# Altium footprint library PcbLib1.PcbLib: 157 footprints (part 9 of 10)
Each footprint in its own frame and in the unit in brackets; x right, y up, seen from the top. Pads: shape width x height; smd on the part's side, far side on the other; paste and mask are expansions set on the pad; w line width, h text height; cw(c..) or ccw(c..) is an arc to the next point about the centre after c.
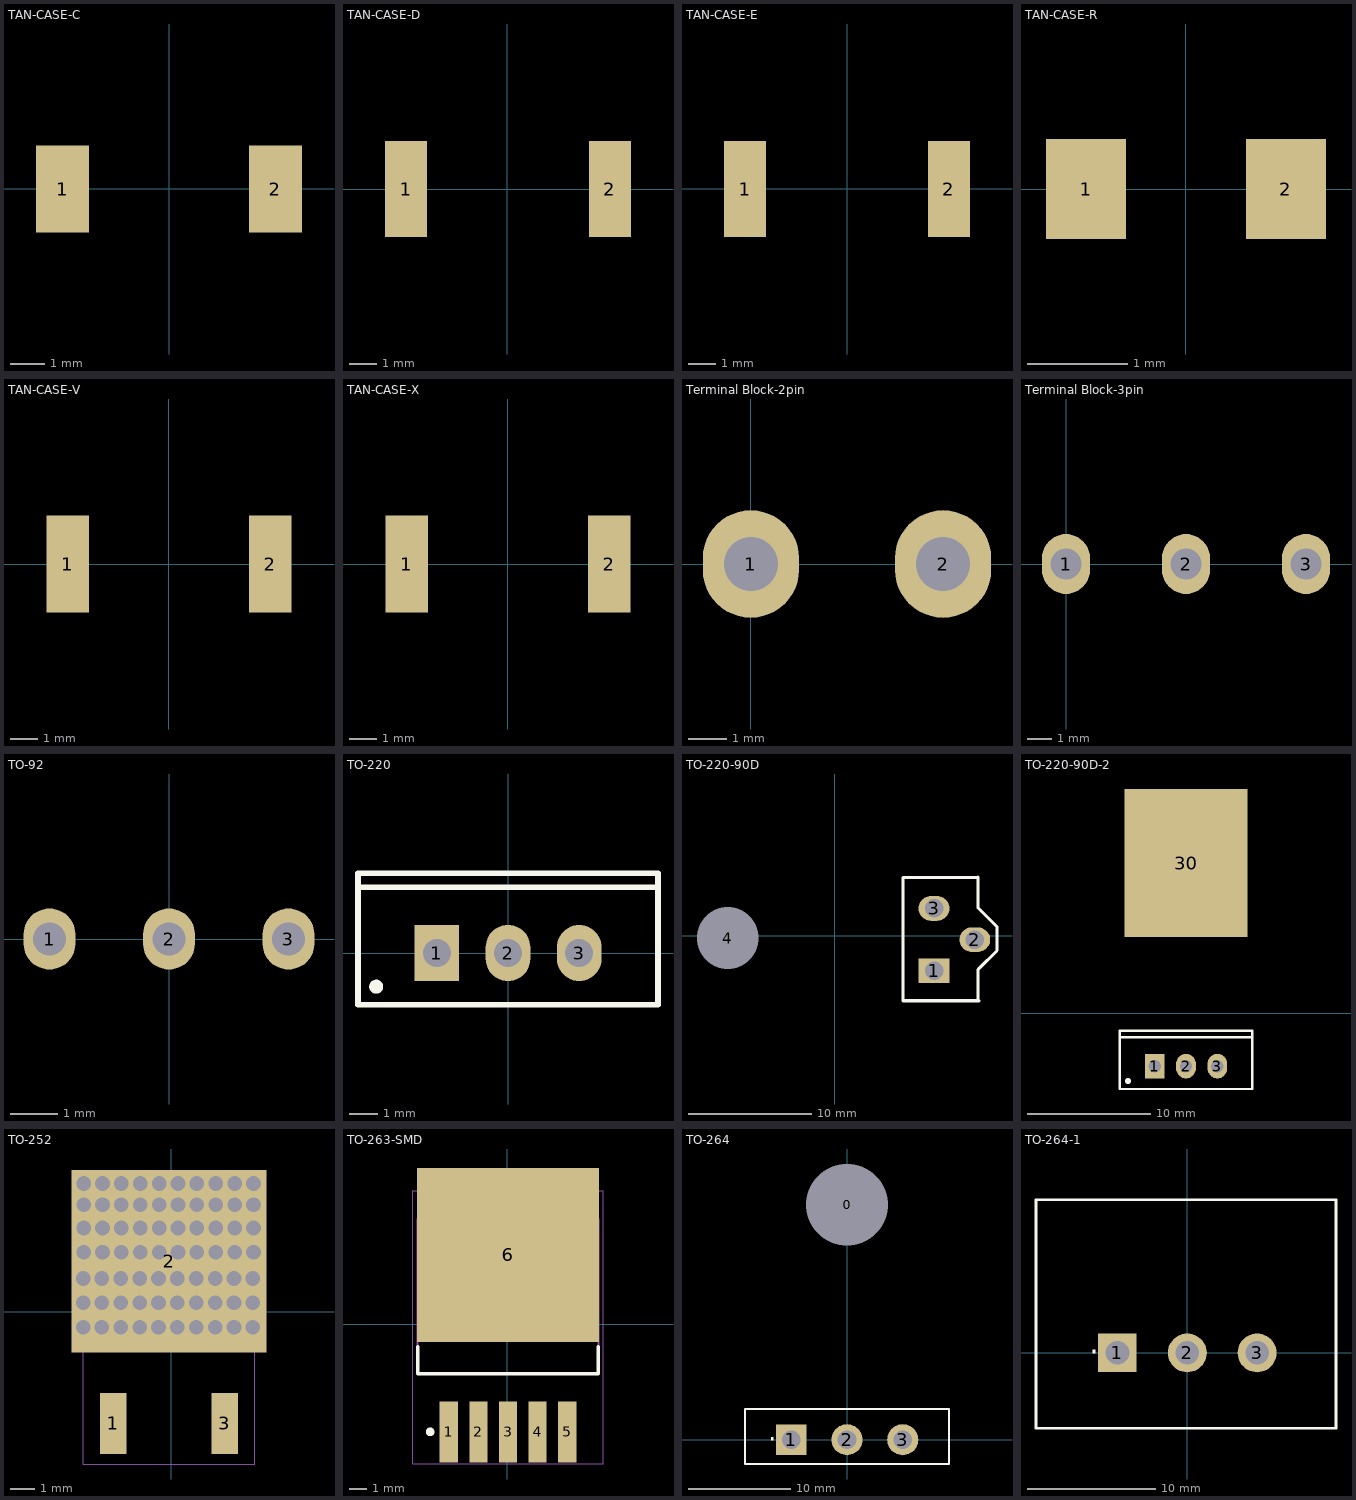
[diagram p8: the footprints below, top view; thin cyan lines are the x and y axes]

## TAN-CASE-C [mm]
pads (2):
  rect 1.524x2.5 smd: 1(-3.05,0) 2(3.05,0)
3D body "User Library-AVX_C_CASE.STEP": height 2.7, standoff 0, extent -3.05,-1.675 3.05,1.675

## TAN-CASE-D [mm]
pads (2):
  rect 1.524x3.5 smd: 1(-3.675,0) 2(3.726,0)
3D body "User Library-AVX_D_CASE.STEP": height 3.01, standoff 0, extent -3.675,-2.225 3.725,2.225

## TAN-CASE-E [mm]
pads (2):
  rect 1.524x3.5 smd: 1(-3.7,0) 2(3.7,0)
3D body "User Library-AVX_E_CASE.STEP": height 4.2, standoff 0, extent -3.7,-2.225 3.7,2.225

## TAN-CASE-R [mm]
pads (2):
  rect 0.8x1 smd: 1(-1,0) 2(1,0)
3D body "User Library-CaseR_2012-12.STEP": height 1.2, standoff 0, extent -1,-0.65 1,0.65

## TAN-CASE-V [mm]
pads (2):
  rect 1.524x3.5 smd: 1(-3.65,0) 2(3.65,0)
3D body "User Library-CaseV_7343-20.STEP": height 2, standoff 0, extent -3.65,-2.15 3.65,2.15

## TAN-CASE-X [mm]
pads (2):
  rect 1.524x3.5 smd: 1(-3.65,0) 2(3.65,0)
3D body "User Library-CaseX_7343-43.STEP": height 4, standoff 0, extent -3.65,-2.15 3.65,2.15

## Terminal Block-2pin [mm]
pads (2):
  oval 2.5x2.8 hole 1.4: 1(0,0) 2(5,0)
3D body "User Library-DG300-5_0-02P-14.STEP": height 12.6, standoff -4.4, extent -3.1,-3.975 7.5,5.025

## Terminal Block-3pin [mm]
pads (3):
  oval 2x2.5 hole 1.3: 1(0,0) 2(5,0) 3(10,0)
3D body "User Library-Terminal block 3 POS.STEP": height 10, standoff -3.05, extent -2.625,-3.175 12.615,4.325

## TO-92 [mm]
pads (3):
  oval 1.1x1.3 hole 0.7: 1(-2.54,0) 2(0,0) 3(2.54,0)
3D body "User Library-TO-92_SS127.STEP": height 8.5, standoff -4, extent -2.77,-1.37 2.77,2.5

## TO-220 [mm]
pads (3):
  rect 1.6x2 hole 1: 1(-2.54,0)
  oval 1.6x2 hole 1: 2(0,0) 3(2.54,0)
Top Overlay:
  circle w0.25: c-4.7,-1.2 r0.125
  lines w0.2: -5.35,2.35 5.35,2.35 ; -5.35,-1.85 5.35,-1.85 5.35,2.85 -5.35,2.85 -5.35,-1.85
Mechanical 13:
  lines w0.1: -5.35,-1.85 -5.35,2.85 5.35,2.85 5.35,-1.85 -5.35,-1.85
Mechanical 15:
  lines w0.1: -0.5,0 0.5,0 ; 0,-0.5 0,0.5
3D body "User Library-Generic TO-220.STEP": height 18.66, standoff -5, extent -4.96,-2.11 4.96,2.425

## TO-220-90D [mm]
pads (4):
  rect 2.5x2 hole 1.5: 1(8.025,-2.85)
  oval 2.5x2 hole 1.5: 2(11.325,-0.325) 3(8.025,2.2)
  oval 2x1.6 hole 5: 4(-8.675,-0.2)
Top Overlay:
  lines w0.254: 5.525,-5.275 5.525,4.7 11.575,4.7 11.6,4.725 11.6,2.237 13.125,0.712 13.125,-1.212 11.6,-2.738 11.6,-5.225 11.65,-5.275 5.525,-5.275
3D body "User Library-Part1-106.STEP": height 0.45, standoff -8.36, extent -11.675,-5.325 11.575,4.695

## TO-220-90D-2 [mm]
pads (4):
  rect 1.6x2 hole 1: 1(11.385,-4.275)
  oval 1.6x2 hole 1: 2(13.925,-4.275) 3(16.465,-4.275)
  rect 10x12 smd: 30(13.925,12.175)
Top Overlay:
  circle w0.25: c9.225,-5.475 r0.125
  lines w0.2: 8.575,-1.925 19.275,-1.925 ; 8.575,-6.125 8.575,-1.425 19.275,-1.425 19.275,-6.125 8.575,-6.125
Mechanical 13:
  lines w0.1: 8.575,-6.125 19.275,-6.125 19.275,-1.425 8.575,-1.425 8.575,-6.125
Mechanical 15:
  lines w0.1: 13.425,-4.275 14.425,-4.275 ; 13.925,-4.775 13.925,-3.775
3D body "User Library-TO220-1.STEP": height 4.5, standoff -3.5, extent 8.75,-4.45 19.15,16.65

## TO-252 [mm]
pads (73):
  rect 1.1x2.5 smd: 1(-2.386,-4.573) 3(2.194,-4.573)
  round 0 hole 0.6: 2(-3.625,-0.625) 2(-3.625,0.375) 2(-3.625,1.375) 2(-3.6,2.45) 2(-3.6,3.45) 2(-3.6,4.4) 2(-3.6,5.275) 2(-2.85,-0.625) 2(-2.85,0.375) 2(-2.85,1.375) 2(-2.825,2.45) 2(-2.825,3.45) 2(-2.825,4.4) 2(-2.825,5.275) 2(-2.075,-0.625) 2(-2.075,0.375) 2(-2.075,1.375) 2(-2.05,2.45) 2(-2.05,3.45) 2(-2.05,4.4) 2(-2.05,5.275) 2(-1.3,-0.625) 2(-1.3,0.375) 2(-1.3,1.375) 2(-1.275,2.45) 2(-1.275,3.45) 2(-1.275,4.4) 2(-1.275,5.275) 2(-0.525,-0.625) 2(-0.525,0.375) 2(-0.525,1.375) 2(-0.5,2.45) 2(-0.5,3.45) 2(-0.5,4.4) 2(-0.5,5.275) 2(0.25,-0.625) 2(0.25,0.375) 2(0.25,1.375) 2(0.275,2.45) 2(0.275,3.45) 2(0.275,4.4) 2(0.275,5.275) 2(1.025,-0.625) 2(1.025,0.375) 2(1.025,1.375) 2(1.05,2.45) 2(1.05,3.45) 2(1.05,4.4) 2(1.05,5.275) 2(1.8,-0.625) 2(1.8,0.375) 2(1.8,1.375) 2(1.825,2.45) 2(1.825,3.45) 2(1.825,4.4) 2(1.825,5.275) 2(2.575,-0.625) 2(2.575,0.375) 2(2.575,1.375) 2(2.6,2.45) 2(2.6,3.45) 2(2.6,4.4) 2(2.6,5.275) 2(3.35,-0.625) 2(3.35,0.375) 2(3.35,1.375) 2(3.375,2.45) 2(3.375,3.45) 2(3.375,4.4) 2(3.375,5.275)
  rect 8x7.5 smd paste-4: 2(-0.096,2.077)
Top Paste:
  region: 2.184,0.702 2.184,-0.608 0.444,-0.608 0.444,0.702
  region: 2.184,4.762 2.184,3.452 0.444,3.452 0.444,4.762
  region: -0.636,4.762 -0.636,3.452 -2.376,3.452 -2.376,4.762
  region: -0.636,0.702 -0.636,-0.608 -2.376,-0.608 -2.376,0.702
  region: 2.184,2.732 2.184,1.422 0.444,1.422 0.444,2.732
  region: -0.636,2.732 -0.636,1.422 -2.376,1.422 -2.376,2.732
Mechanical 15:
  lines w0.05: -3.616,-6.243 -3.616,5.377 3.424,5.377 3.424,-6.243 -3.616,-6.243
3D body "CircuitWorks-TO-252.STEP": height 2.3, standoff 0, extent -3.39,-5.248 3.19,4.452

## TO-263-SMD [mm]
pads (6):
  rect 1.05x3.5 smd: 1(-3.35,-6.174) 2(-1.65,-6.174) 3(0.05,-6.174) 4(1.75,-6.174) 5(3.45,-6.174)
  rect 10.45x10 smd: 6(0.05,4)
Top Overlay:
  circle w0.25: c-4.425,-6.174 r0.125
  lines w0.2: -5.15,-1.274 -5.15,-2.824 5.25,-2.824 5.25,-1.274
Mechanical 13:
  lines w0.1: -5.15,-2.824 5.25,-2.824 5.25,6.066 -5.15,6.066 -5.15,-2.824
Mechanical 15:
  lines w0.05: -5.425,-8.024 5.525,-8.024 5.525,7.676 -5.425,7.676 -5.425,-8.024
  lines w0.1: -0.45,-0.174 0.55,-0.174 ; 0.05,-0.674 0.05,0.326
3D body "SW3dPS-TO263-5.STEP": height 4.68, standoff -0.12, extent -4.95,-7.704 5.05,7.966

## TO-264 [mm]
pads (4):
  round 1.6 hole 8: 0(0,23)
  rect 3x3 hole 1.85: 1(-5.46,0)
  round 3.048 hole 1.85: 2(0,0) 3(5.46,0)
Top Overlay:
  region: -7.4,-0.05 -7.4,0.25 -7.2,0.25 -7.2,-0.05
  lines w0.2: -10,-2.38 -10,3.02 10,3.02 10,-2.38 -10,-2.38
3D body "User Library-TO-264-H.STEP": height 3.1, standoff -15, extent -10.284,-0.356 10.216,30.923

## TO-264-1 [mm]
pads (3):
  rect 3x3 hole 1.85: 1(-5.46,0)
  round 3.048 hole 1.85: 2(0,0) 3(5.46,0)
Top Overlay:
  region: -7.4,-0.05 -7.4,0.25 -7.2,0.25 -7.2,-0.05
  lines w0.2: -11.825,-5.9 11.625,-5.9 11.625,11.975 -11.825,11.975 -11.825,-5.9
3D body "User Library-290001.STEP": height 33.53, standoff -3.8, extent -11.856,-5.876 11.6,12.026
3D body "User Library-to264.STEP": height 28.72, standoff -17.25, extent -10.4,-2.525 10.1,2.675